# Altium footprint library STM32F0.PcbLib: 228 footprints (part 3 of 16)
Each footprint in its own frame and in the unit in brackets; x right, y up, seen from the top. Pads: shape width x height; smd on the part's side, far side on the other; paste and mask are expansions set on the pad; w line width, h text height; cw(c..) or ccw(c..) is an arc to the next point about the centre after c.
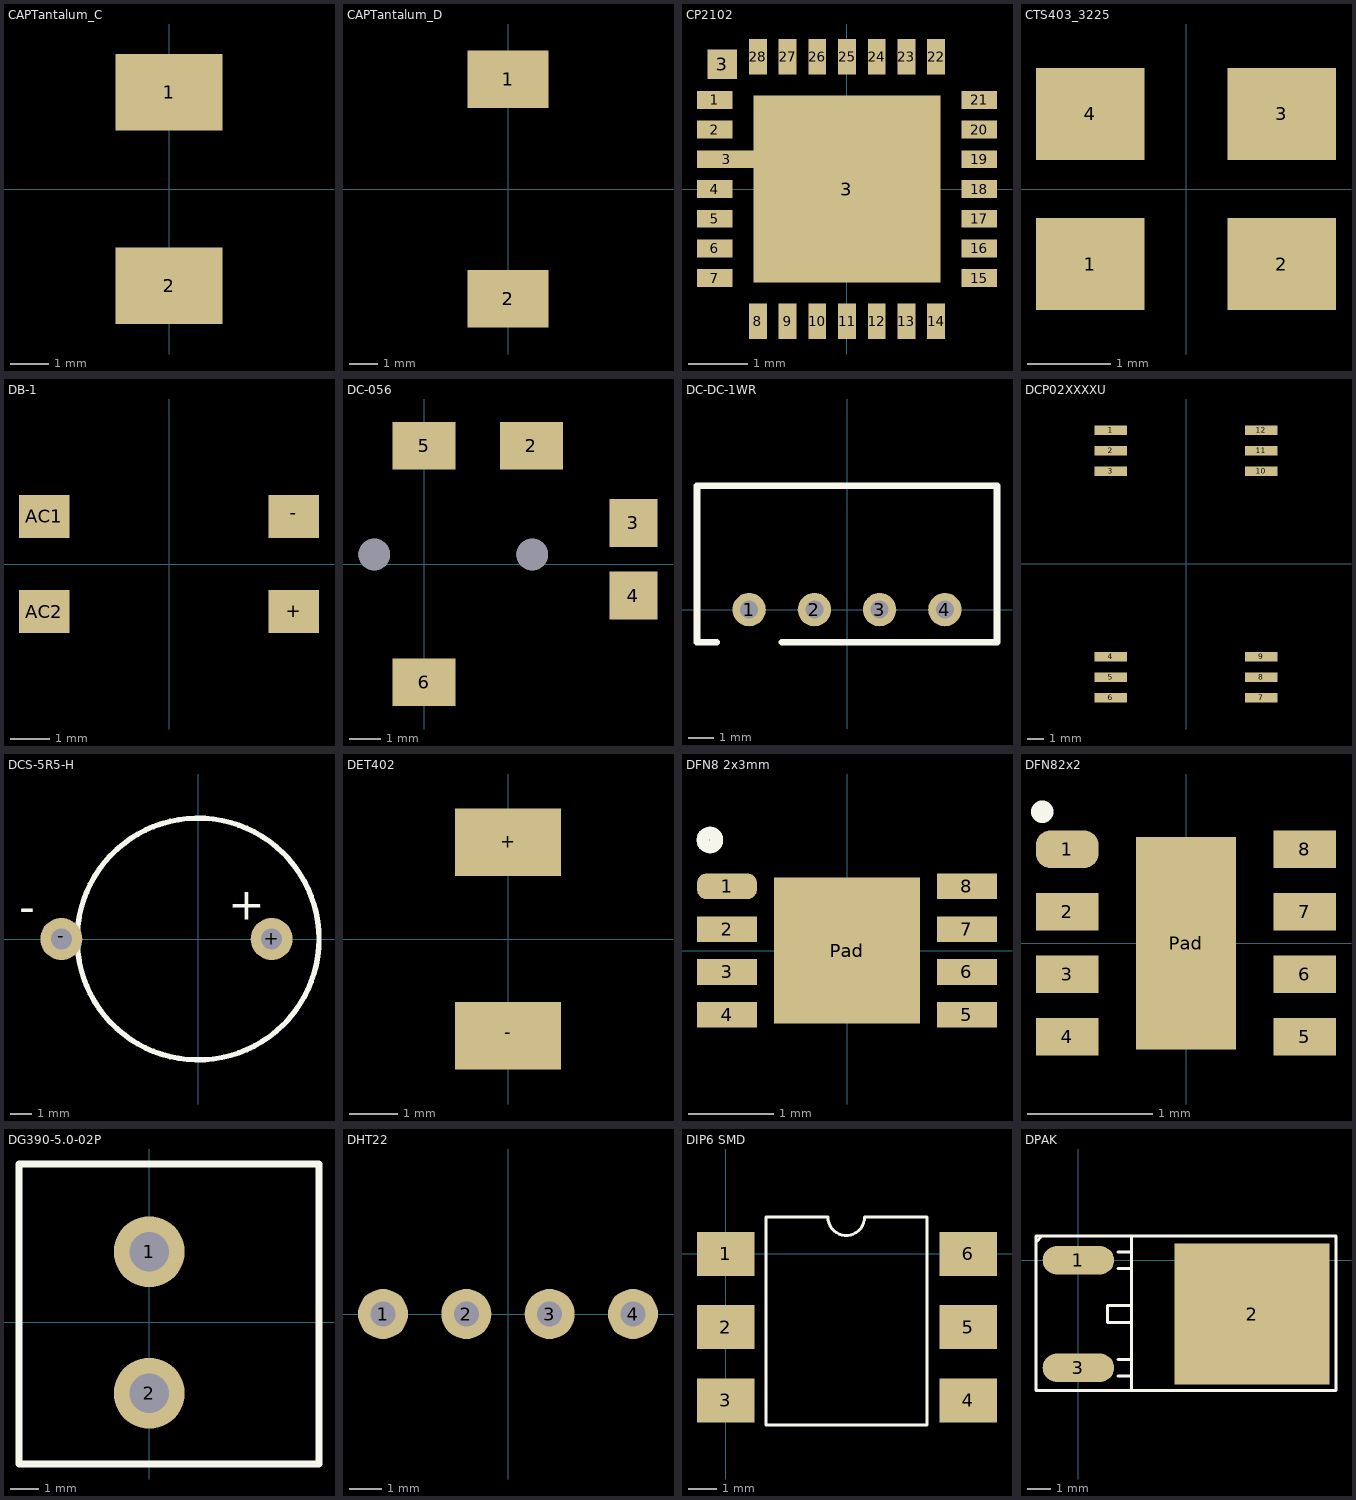
[diagram p2: the footprints below, top view; thin cyan lines are the x and y axes]

## CAPTantalum_C [mm]
pads (2):
  rect 2.8x2 smd: 1(0,2.54) 2(0,-2.54)
3D body "User Library-CAP_TANT_6032-28_yC.step": height 2.8, standoff 0, extent -1.75,-3.15 1.75,3.15

## CAPTantalum_D [mm]
pads (2):
  rect 2.8x2 smd: 1(0,3.8) 2(0,-3.8)
3D body "User Library-CAP_TANT_7343-31.step": height 3.1, standoff 0, extent -2.3,-3.8 2.3,3.8

## CP2102 [mm]
pads (30):
  rect 0.6x0.3 smd: 1(-2.225,1.5) 2(-2.225,1) 4(-2.225,0) 5(-2.225,-0.5) 6(-2.225,-1) 7(-2.225,-1.5) 15(2.225,-1.5) 16(2.225,-1) 17(2.225,-0.5) 18(2.225,0) 19(2.225,0.5) 20(2.225,1) 21(2.225,1.5)
  rect 0.5x0.5 smd: 3(-2.1,2.1)
  rect 1x0.3 smd: 3(-2.025,0.5)
  rect 3.15x3.15 smd: 3(0,0)
  rect 0.3x0.6 smd: 8(-1.5,-2.225) 9(-1,-2.225) 10(-0.5,-2.225) 11(0,-2.225) 12(0.5,-2.225) 13(1,-2.225) 14(1.5,-2.225) 22(1.5,2.225) 23(1,2.225) 24(0.5,2.225) 25(0,2.225) 26(-0.5,2.225) 27(-1,2.225) 28(-1.5,2.225)
3D body "User Library-CP2201_QFN28.step": height 1.07, standoff 0, extent -2.5,-2.5 2.5,2.5

## CTS403_3225 [mm]
pads (4):
  rect 1.3x1.1 smd: 1(-1.15,-0.9) 2(1.15,-0.9) 3(1.15,0.9) 4(-1.15,0.9)
3D body "User Library-CTS.step": height 0.77, standoff 0, extent -1.6,-1.25 1.6,1.25

## DB-1 [mm]
pads (4):
  rect 1.3x1.1 smd: +(3.2,-1.22) -(3.2,1.22) AC1(-3.2,1.22) AC2(-3.2,-1.22)
3D body "User Library-DB1-MS.STEP": height 2.65, standoff -0.25, extent -3.808,-2.439 3.792,2.461

## DC-056 [mm]
pads (7):
  rect 2x1.5 smd: 2(3.4,3.75) 5(0,3.75) 6(0,-3.75)
  rect 1.524x1.524 smd: 3(6.625,1.3) 4(6.625,-1)
  round 1 hole 1 unplated: ""(-1.575,0.3) ""(3.425,0.3)
3D body "DC-056.stp": height 3, standoff -1, extent -3.075,-4.4 7.325,4.4

## DC-DC-1WR [mm]
pads (4):
  round 1.3 hole 0.7: 1(-3.81,0) 2(-1.27,0) 3(1.27,0) 4(3.81,0)
Top Overlay:
  lines w0.254: -5.08,-1.27 -5.842,-1.27 -5.842,4.826 5.842,4.826 5.842,-1.27 -2.54,-1.27
3D body "User Library-SIL-K4.STEP": height 10.06, standoff -2.6, extent -5.85,-1.27 5.85,4.84

## DCP02XXXXU [mm]
pads (12):
  rect 2x0.6 smd: 1(-4.65,8.255) 2(-4.65,6.985) 3(-4.65,5.715) 4(-4.65,-5.715) 5(-4.65,-6.985) 6(-4.65,-8.255) 7(4.65,-8.255) 8(4.65,-6.985) 9(4.65,-5.715) 10(4.65,5.715) 11(4.65,6.985) 12(4.65,8.255)
3D body "DCP020505.step": height 2.63, standoff -0.02, extent -5.15,-8.935 5.15,8.966

## DCS-5R5-H [mm]
pads (2):
  round 2 hole 1: +(3.5,0) -(-6.5,0)
Top Overlay:
  circle w0.254: c0,0 r5.75
  text "+" at 1.444,0.92 h1.52
  text "-" at -8.516,0.782 h1.52
3D body "ion.STEP": height 6.8, standoff -1, extent -6.65,-5.75 5.75,5.75

## DET402 [mm]
pads (2):
  rect 2.2x1.4 smd: +(0,2) -(0,-2)
3D body "User Library-DET402.step": height 2, standoff -0.05, extent -1.5,-2.45 1.5,2.44

## DFN8 2x3mm [mm]
pads (9):
  rrect75% 0.7x0.3 smd: 1(-1.4,0.75)
  rect 0.7x0.3 smd: 2(-1.4,0.25) 3(-1.4,-0.25) 4(-1.4,-0.75) 5(1.4,-0.75) 6(1.4,-0.25) 7(1.4,0.25) 8(1.4,0.75)
  rect 1.7x1.7 smd: Pad(0,0)
Top Overlay:
  circle w0.15: c-1.6,1.29 r0.08
3D body "User Library-DFN-8-2.step": height 0.9, standoff 0, extent -1.523,-1.001 1.517,0.999

## DFN82x2 [mm]
pads (9):
  rrect75% 0.5x0.3 smd: 1(-0.95,0.75)
  rect 0.5x0.3 smd: 2(-0.95,0.25) 3(-0.95,-0.25) 4(-0.95,-0.75) 5(0.95,-0.75) 6(0.95,-0.25) 7(0.95,0.25) 8(0.95,0.75)
  rect 0.8x1.7 smd: Pad(0,0)
Top Overlay:
  circle w0.15: c-1.15,1.05 r0.014
3D body "User Library-DFN-8(2x2).step": height 0.7, standoff -0.05, extent -1.025,-1 1.025,1

## DG390-5.0-02P [mm]
pads (2):
  round 2.5 hole 1.4: 1(0,2.5) 2(0,-2.5)
Top Overlay:
  lines w0.254: -4.6,-5 6,-5 6,5.6 -4.6,5.6 -4.6,-5
3D body "DG390-5.0-2p.STEP": height 14, standoff -4.8, extent -4.6,-5 6,5.6

## DHT22 [mil]
pads (4):
  round 60 hole 30: 1(-150,0) 2(-50,0) 3(50,0) 4(150,0)
3D body "User Library-DHT22_HOR.step": height 315.35, standoff -49.21, extent -297.24,0 297.24,1185.05

## DIP6 SMD [mm]
pads (6):
  rect 2x1.524 smd: 1(0,0) 2(0,-2.54) 3(0,-5.08) 4(8.4,-5.08) 5(8.4,-2.54) 6(8.4,0)
Top Overlay:
  lines w0.102: 6.974,-5.93 1.397,-5.93 1.397,1.27 3.538,1.27 ccw(c4.173,1.27) 4.808,1.27 6.974,1.27 6.974,-5.925
3D body "User Library-moc3051.step": height 5.93, standoff 0, extent -0.769,-6.99 9.131,1.9

## DPAK [mm]
pads (3):
  oval 3x1.2 smd: 1(0,0) 3(0,-4.5)
  rect 6.5x5.9 smd: 2(7.275,-2.25)
Top Overlay:
  lines w0.127: -1.778,0.762 -1.524,1.016 ; 1.65,-4.85 2.225,-4.85 ; 1.65,-4.15 2.225,-4.15 ; 2.225,-5.45 2.225,0.95 ; 2.225,-2.6 1.225,-2.6 1.225,-1.9 2.225,-1.9 ; -1.778,-5.461 -1.778,1.016 10.795,1.016 10.795,-5.461 -1.778,-5.461 ; 1.65,-0.35 2.225,-0.35 1.65,-0.35 ; 1.65,0.35 2.225,0.35 1.65,0.35
3D body "User Library-DPAK-1.step": height 2.41, standoff 0, extent -0.502,-5.48 9.436,1.06